# Altium footprint library PcbLib1.PcbLib: 49 footprints (part 4 of 4)
Each footprint in its own frame and in the unit in brackets; x right, y up, seen from the top. Pads: shape width x height; smd on the part's side, far side on the other; paste and mask are expansions set on the pad; w line width, h text height; cw(c..) or ccw(c..) is an arc to the next point about the centre after c.
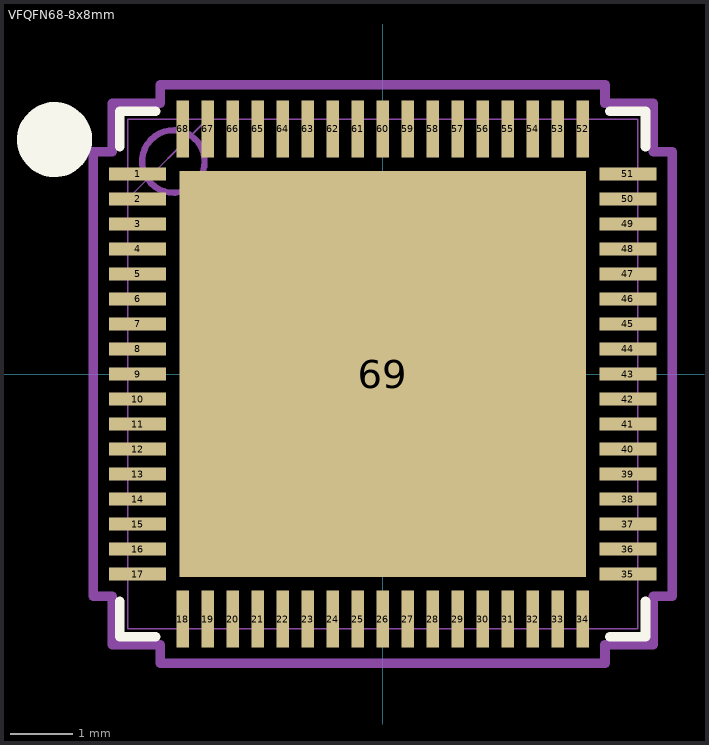
[diagram p3: the footprint, top view; thin cyan lines are the x and y axes]

## VFQFN68-8x8mm [mm]
pads (69):
  rect 0.91x0.204 smd paste+0 mask+0: 1(-3.922,3.2) 2(-3.922,2.8) 3(-3.922,2.4) 4(-3.922,2) 5(-3.922,1.6) 6(-3.922,1.2) 7(-3.922,0.8) 8(-3.922,0.4) 9(-3.922,0) 10(-3.922,-0.4) 11(-3.922,-0.8) 12(-3.922,-1.2) 13(-3.922,-1.6) 14(-3.922,-2) 15(-3.922,-2.4) 16(-3.922,-2.8) 17(-3.922,-3.2) 35(3.922,-3.2) 36(3.922,-2.8) 37(3.922,-2.4) 38(3.922,-2) 39(3.922,-1.6) 40(3.922,-1.2) 41(3.922,-0.8) 42(3.922,-0.4) 43(3.922,0) 44(3.922,0.4) 45(3.922,0.8) 46(3.922,1.2) 47(3.922,1.6) 48(3.922,2) 49(3.922,2.4) 50(3.922,2.8) 51(3.922,3.2)
  rect 0.204x0.91 smd paste+0 mask+0: 18(-3.2,-3.922) 19(-2.8,-3.922) 20(-2.4,-3.922) 21(-2,-3.922) 22(-1.6,-3.922) 23(-1.2,-3.922) 24(-0.8,-3.922) 25(-0.4,-3.922) 26(0,-3.922) 27(0.4,-3.922) 28(0.8,-3.922) 29(1.2,-3.922) 30(1.6,-3.922) 31(2,-3.922) 32(2.4,-3.922) 33(2.8,-3.922) 34(3.2,-3.922) 52(3.2,3.922) 53(2.8,3.922) 54(2.4,3.922) 55(2,3.922) 56(1.6,3.922) 57(1.2,3.922) 58(0.8,3.922) 59(0.4,3.922) 60(0,3.922) 61(-0.4,3.922) 62(-0.8,3.922) 63(-1.2,3.922) 64(-1.6,3.922) 65(-2,3.922) 66(-2.4,3.922) 67(-2.8,3.922) 68(-3.2,3.922)
  rect 6.502x6.502 smd paste-3.238 mask+0: 69(0,0)
Top Overlay:
  circle w0.6: c-5.25,3.75 r0.3
  lines w0.152: -4.204,-3.635 -4.204,-4.204 -3.635,-4.204 ; -4.204,3.635 -4.204,4.204 -3.635,4.204 ; 3.635,-4.204 4.204,-4.204 4.204,-3.635 ; 3.635,4.204 4.204,4.204 4.204,3.635
Top Paste:
  region: -2.051,3.151 -3.151,3.151 -3.151,2.051 -2.051,2.051
  region: -2.051,1.851 -3.151,1.851 -3.151,0.75 -2.051,0.75
  region: -2.051,0.55 -3.151,0.55 -3.151,-0.55 -2.051,-0.55
  region: -2.051,-0.75 -3.151,-0.75 -3.151,-1.851 -2.051,-1.851
  region: -2.051,-2.051 -3.151,-2.051 -3.151,-3.151 -2.051,-3.151
  region: -0.75,3.151 -1.851,3.151 -1.851,2.051 -0.75,2.051
  region: -0.75,1.851 -1.851,1.851 -1.851,0.75 -0.75,0.75
  region: -0.75,0.55 -1.851,0.55 -1.851,-0.55 -0.75,-0.55
  region: -0.75,-0.75 -1.851,-0.75 -1.851,-1.851 -0.75,-1.851
  region: -0.75,-2.051 -1.851,-2.051 -1.851,-3.151 -0.75,-3.151
  region: 0.55,3.151 -0.55,3.151 -0.55,2.051 0.55,2.051
  region: 0.55,1.851 -0.55,1.851 -0.55,0.75 0.55,0.75
  region: 0.55,0.55 -0.55,0.55 -0.55,-0.55 0.55,-0.55
  region: 0.55,-0.75 -0.55,-0.75 -0.55,-1.851 0.55,-1.851
  region: 0.55,-2.051 -0.55,-2.051 -0.55,-3.151 0.55,-3.151
  region: 1.851,3.151 0.75,3.151 0.75,2.051 1.851,2.051
  region: 1.851,1.851 0.75,1.851 0.75,0.75 1.851,0.75
  region: 1.851,0.55 0.75,0.55 0.75,-0.55 1.851,-0.55
  region: 1.851,-0.75 0.75,-0.75 0.75,-1.851 1.851,-1.851
  region: 1.851,-2.051 0.75,-2.051 0.75,-3.151 1.851,-3.151
  region: 3.151,3.151 2.051,3.151 2.051,2.051 3.151,2.051
  region: 3.151,1.851 2.051,1.851 2.051,0.75 3.151,0.75
  region: 3.151,0.55 2.051,0.55 2.051,-0.55 3.151,-0.55
  region: 3.151,-0.75 2.051,-0.75 2.051,-1.851 3.151,-1.851
  region: 3.151,-2.051 2.051,-2.051 2.051,-3.151 3.151,-3.151
Mechanical 13:
  circle w0.1: c-3.35,3.4 r0.5
  lines w0.025: -4.077,2.807 -2.807,4.077 ; -4.077,-4.077 4.077,-4.077 4.077,4.077 -4.077,4.077 -4.077,-4.077 ; -4.077,-3.327 -4.077,-3.073 -4.077,-3.327 ; -4.077,-2.927 -4.077,-2.673 -4.077,-2.927 ; -4.077,-2.527 -4.077,-2.273 -4.077,-2.527 ; -4.077,-2.127 -4.077,-1.873 -4.077,-2.127 ; -4.077,-1.727 -4.077,-1.473 -4.077,-1.727 ; -4.077,-1.327 -4.077,-1.073 -4.077,-1.327 ; -4.077,-0.927 -4.077,-0.673 -4.077,-0.927 ; -4.077,-0.527 -4.077,-0.273 -4.077,-0.527 ; -4.077,-0.127 -4.077,0.127 -4.077,-0.127 ; -4.077,0.273 -4.077,0.527 -4.077,0.273 ; -4.077,0.673 -4.077,0.927 -4.077,0.673 ; -4.077,1.073 -4.077,1.327 -4.077,1.073 ; -4.077,1.473 -4.077,1.727 -4.077,1.473 ; -4.077,1.873 -4.077,2.127 -4.077,1.873 ; -4.077,2.273 -4.077,2.527 -4.077,2.273 ; -4.077,2.673 -4.077,2.927 -4.077,2.673 ; -4.077,3.073 -4.077,3.327 -4.077,3.073 ; -3.327,-4.077 -3.073,-4.077 -3.327,-4.077 ; -3.327,4.077 -3.073,4.077 -3.327,4.077 ; -2.927,4.077 -2.673,4.077 -2.927,4.077 ; -2.527,4.077 -2.273,4.077 -2.527,4.077 ; -2.127,4.077 -1.873,4.077 -2.127,4.077 ; -1.727,4.077 -1.473,4.077 -1.727,4.077 ; -1.327,4.077 -1.073,4.077 -1.327,4.077 ; -0.927,4.077 -0.673,4.077 -0.927,4.077 ; -0.527,4.077 -0.273,4.077 -0.527,4.077 ; -0.127,4.077 0.127,4.077 -0.127,4.077 ; 0.273,4.077 0.527,4.077 0.273,4.077 ; 0.673,4.077 0.927,4.077 0.673,4.077 ; 1.073,4.077 1.327,4.077 1.073,4.077 ; 1.473,4.077 1.727,4.077 1.473,4.077 ; 1.873,4.077 2.127,4.077 1.873,4.077 ; 2.273,4.077 2.527,4.077 2.273,4.077 ; 2.673,4.077 2.927,4.077 2.673,4.077 ; 3.073,-4.077 3.327,-4.077 3.073,-4.077 ; 3.073,4.077 3.327,4.077 3.073,4.077 ; 4.077,-3.327 4.077,-3.073 4.077,-3.327 ; 4.077,-2.927 4.077,-2.673 4.077,-2.927 ; 4.077,-2.527 4.077,-2.273 4.077,-2.527 ; 4.077,-2.127 4.077,-1.873 4.077,-2.127 ; 4.077,-1.727 4.077,-1.473 4.077,-1.727 ; 4.077,-1.327 4.077,-1.073 4.077,-1.327 ; 4.077,-0.927 4.077,-0.673 4.077,-0.927 ; 4.077,-0.527 4.077,-0.273 4.077,-0.527 ; 4.077,-0.127 4.077,0.127 4.077,-0.127 ; 4.077,0.273 4.077,0.527 4.077,0.273 ; 4.077,0.673 4.077,0.927 4.077,0.673 ; 4.077,1.073 4.077,1.327 4.077,1.073 ; 4.077,1.473 4.077,1.727 4.077,1.473 ; 4.077,1.873 4.077,2.127 4.077,1.873 ; 4.077,2.273 4.077,2.527 4.077,2.273 ; 4.077,2.673 4.077,2.927 4.077,2.673 ; 4.077,3.073 4.077,3.327 4.077,3.073
Mechanical 15:
  lines w0.152: -4.631,-3.556 -4.331,-3.556 -4.331,-4.331 -3.556,-4.331 -3.556,-4.631 3.556,-4.631 3.556,-4.331 4.331,-4.331 4.331,-3.556 4.631,-3.556 4.631,3.556 4.331,3.556 4.331,4.331 3.556,4.331 3.556,4.631 -3.556,4.631 -3.556,4.331 -4.331,4.331 -4.331,3.556 -4.631,3.556 -4.631,-3.556
3D body "QFN68(8x8mm).step": height 0.8, standoff -0.05, extent -4.02,-4.02 4.02,4.02